# Altium footprint library TelemetriaGPRS-V3.PcbLib: 48 footprints (part 2 of 3)
Each footprint in its own frame and in the unit in brackets; x right, y up, seen from the top. Pads: shape width x height; smd on the part's side, far side on the other; paste and mask are expansions set on the pad; w line width, h text height; cw(c..) or ccw(c..) is an arc to the next point about the centre after c.
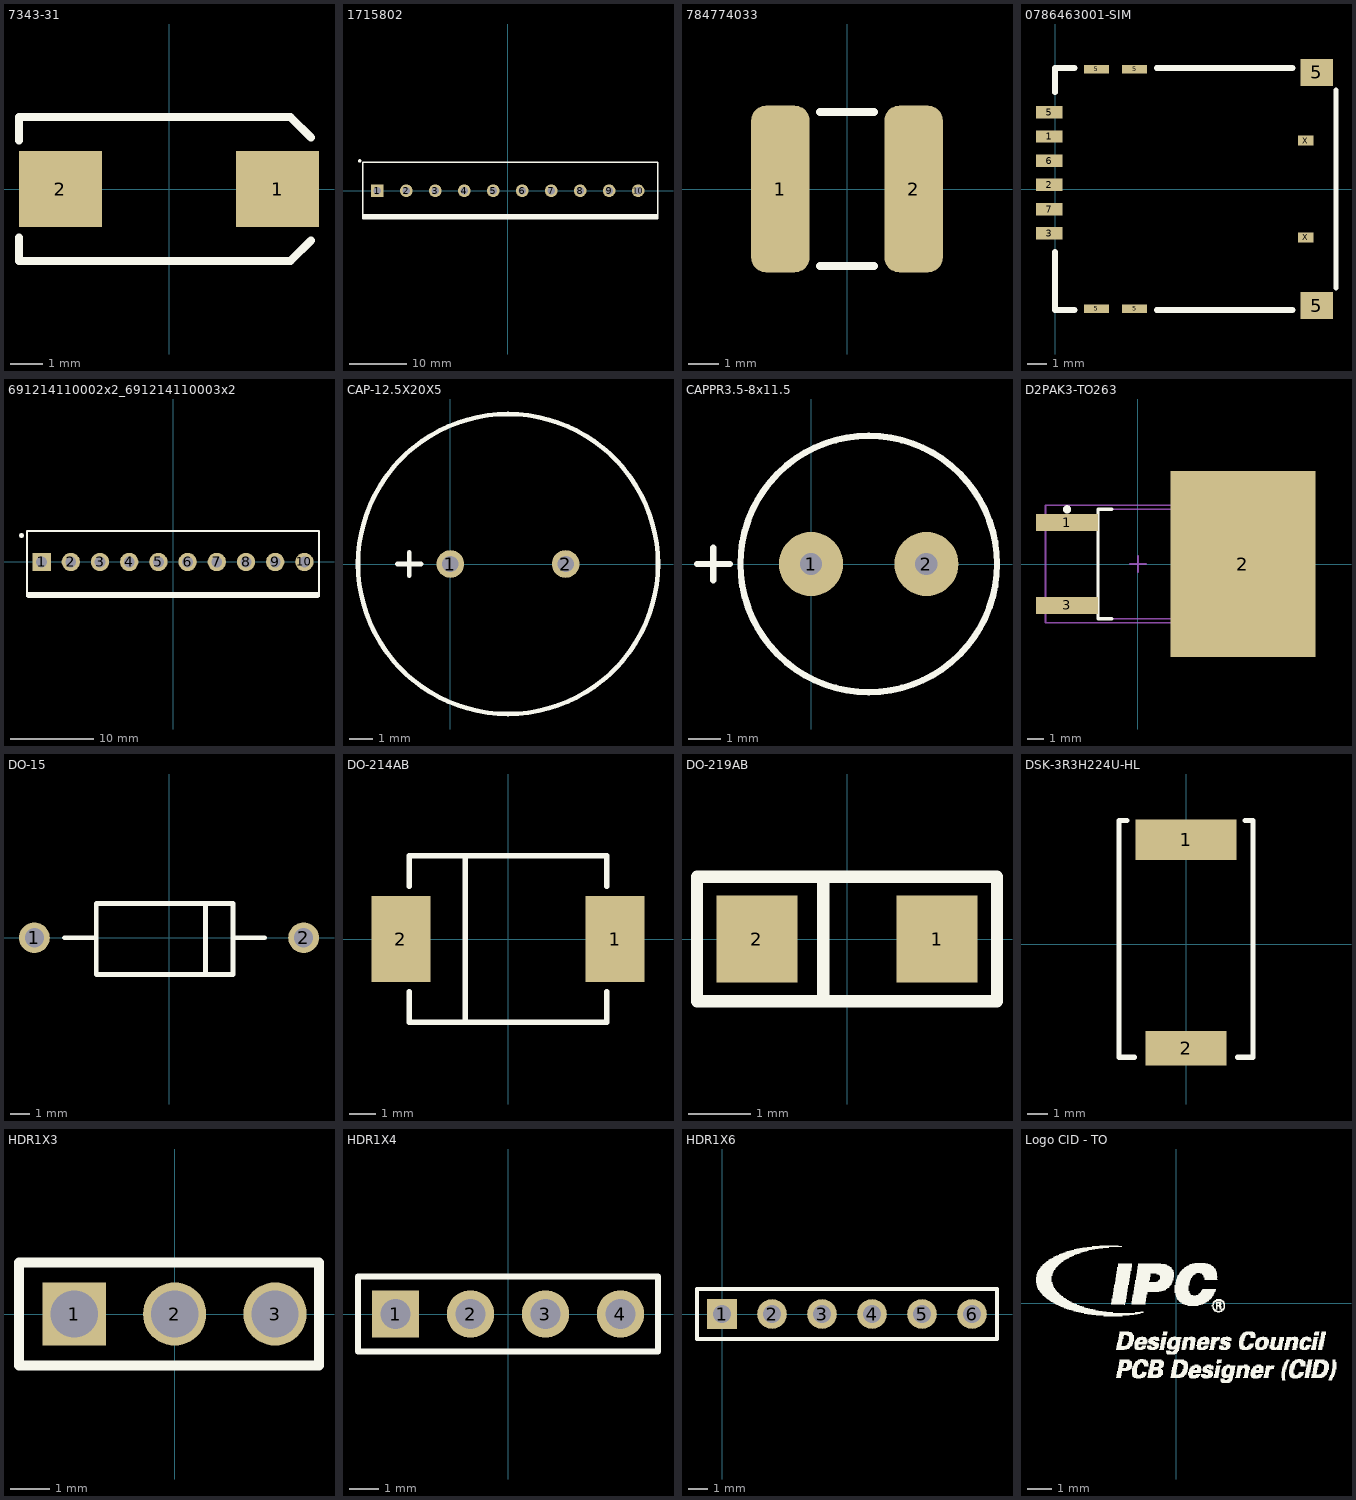
[diagram p1: the footprints below, top view; thin cyan lines are the x and y axes]

## 7343-31 [mm]
height 0.55
pads (2):
  rect 2.6x2.39 smd: 1(3.4,0) 2(-3.4,0)
Top Overlay:
  lines w0.254: -4.699,-1.524 -4.699,-2.25 3.81,-2.25 4.445,-1.615 ; -4.699,1.524 -4.699,2.25 3.81,2.25 4.445,1.615
3D body: height 3.1, standoff 0, extent -3.8,-2.286 3.8,2.314

## 1715802 [mm] "10 Position Wire to Board Terminal Block Horizontal with Board 0.200\" (5.08mm) Through Hole"
pads (11):
  round 0.6 on Top Overlay: 1(-25.828,5.207)
  rect 2.2x2.2 hole 1.3: 1(-22.78,0)
  round 2.2 hole 1.3: 2(-17.7,0) 3(-12.64,0) 4(-7.58,0) 5(-2.52,0) 6(2.54,0) 7(7.6,0) 8(12.66,0) 9(17.72,0) 10(22.78,0)
Top Overlay:
  lines w0.254: -25.28,-4.445 26.242,-4.445 ; -25.28,-4.191 26.242,-4.191 ; -25.193,-4.699 26.242,-4.699 ; -25.28,-4.9 26.242,-4.9 26.242,4.953 -25.28,4.953 ; -25.28,-4.9 -25.28,4.953 ; -25.28,-4.9 -25.28,4.953
3D body: height 14.2, standoff -3.5, extent -25.28,-4.9 26.261,4.9

## 784774033 [mm]
pads (2):
  rrect50% 1.925x5.5 smd: 1(-2.2,0) 2(2.2,0)
Top Overlay:
  lines w0.254: -0.889,-2.54 0.889,-2.54 ; -0.889,2.54 0.889,2.54
3D body: height 4.5, standoff 0, extent -2.889,-2.6 2.898,2.6

## 0786463001-SIM [mm]
pads (14):
  rect 1.4x0.65 smd: 1(-0.3,2.755) 2(-0.3,0.215) 3(-0.3,-2.325) 5(-0.3,4.025) 6(-0.3,1.485) 7(-0.3,-1.055)
  rect 1.3x0.45 smd: 5(2.17,-6.27) 5(2.17,6.27) 5(4.17,-6.27) 5(4.17,6.27)
  rect 1.7x1.4 smd: 5(13.73,-6.11) 5(13.73,6.11)
  rect 0.8x0.54 smd: X(13.15,-2.54) X(13.15,2.54)
Top Overlay:
  lines w0.254: 14.732,-5.207 14.732,5.207
  lines w0.3: 0,-3.302 0,-6.35 1.016,-6.35 ; 0,5.08 0,6.35 1.016,6.35 ; 5.334,-6.35 12.446,-6.35 ; 5.334,6.35 12.446,6.35
3D body: height 1.46, standoff 0.01, extent -0.381,-6.525 15.069,6.525

## 691214110002x2_691214110003x2 [mm] "10 Position Wire to Board Terminal Block Horizontal with Board 0.200\" (5.08mm) Through Hole"
pads (11):
  round 0.6 on Top Overlay: 1(-18.161,3.175)
  rect 2.2x2.2 hole 1.3: 1(-15.75,0)
  round 2.2 hole 1.3: 2(-12.25,0) 3(-8.75,0) 4(-5.25,0) 5(-1.75,0) 6(1.75,0) 7(5.25,0) 8(8.75,0) 9(12.25,0) 10(15.75,0)
Top Overlay:
  lines w0.254: 17.5,-3.556 17.5,-3.836 ; -17.5,-3.911 -17.5,-3.7 ; -17.5,-3.911 -17.474,-3.937 17.145,-3.937 17.399,-3.937 17.5,-3.836 ; -17.5,-3.911 -17.5,-4.09 -17.399,-4.191 17.399,-4.191 17.5,-4.09 17.5,-3.836 ; -17.5,-3.7 17.5,-3.7 17.5,3.7 -17.5,3.7 -17.5,-3.7

## CAP-12.5X20X5 [mm]
pads (2):
  round 1.2 hole 0.7: 1(0,0) 2(5,0)
Top Overlay:
  circle w0.2: c2.5,0 r6.5
  lines w0.2: -2.286,0 -1.27,0 ; -1.778,-0.508 -1.778,0.508
3D body: height 22, standoff -3, extent -3.96,-6.48 8.984,6.48

## CAPPR3.5-8x11.5 [mm]
pads (2):
  round 2 hole 0.7: 1(0,0) 2(3.6,0)
Top Overlay:
  circle w0.2: c1.8,0 r4
  lines w0.2: -3.556,0 -2.54,0 ; -3.048,-0.508 -3.048,0.508
3D body: height 11.83, standoff -3.68, extent -2.209,-4.025 5.842,4.025

## D2PAK3-TO263 [mm] "D-PAK, 3-Pads, Body 6.2x6.7mm (max), IPC Medium Density"
height 2.4
pads (3):
  rect 3.81x1.05 smd: 1(-4.35,2.54) 3(-4.35,-2.54)
  rect 8.89x11.43 smd: 2(6.429,0)
Top Overlay:
  circle w0.25: c-4.35,3.355 r0.125
  lines w0.2: -1.6,-3.35 -2.45,-3.35 -2.45,3.35 -1.6,3.35
Mechanical 13:
  lines w0.1: -2.45,-3.35 -2.45,3.35 3.75,3.35 3.75,-3.35 -2.45,-3.35
Mechanical 15:
  lines w0.1: -0.5,0 0.5,0 ; 0,-0.5 0,0.5 ; -5.675,-3.6 -5.675,3.6 5.675,3.6 5.675,-3.6 -5.675,-3.6
3D body: height 4.98, standoff -0.03, extent -5.6,-5.08 9.664,5.08

## DO-15 [mm]
height 1.5
pads (2):
  round 1.6 hole 1: 1(-7,0) 2(7,0)
Top Overlay:
  lines w0.254: -5.436,0 -3.785,0 ; 1.905,-1.905 1.905,1.778 ; 3.327,0 4.978,0 ; -3.785,0 -3.785,1.778 3.327,1.778 3.327,-1.905 -3.785,-1.905 -3.785,0
3D body: height 4.29, standoff -1.5, extent -7.23,-1.787 7.23,1.778

## DO-214AB [mm]
pads (2):
  rect 2.2x3.2 smd: 1(4,0) 2(-4,0)
Top Overlay:
  lines w0.2: -3.683,-1.967 -3.683,-3.11 3.683,-3.11 3.683,-1.967 ; -3.683,1.967 -3.683,3.11 3.683,3.11 3.683,1.967 ; -1.59,-3.11 -1.59,3.11
3D body: height 2.4, standoff 0.03, extent -4.065,-3.048 4.065,3.052

## DO-219AB [mm]
pads (2):
  rect 1.3x1.4 smd: 1(1.45,0) 2(-1.45,0)
Top Overlay:
  lines w0.2: -0.381,-1 -0.381,1 ; -2.413,-1 2.413,-1 2.413,1 -2.413,1 -2.413,-0.746 -2.413,-1
3D body: height 1.25, standoff 0, extent -1.95,-0.95 1.95,0.95

## DSK-3R3H224U-HL [mm]
pads (2):
  rect 5x2 smd: 1(0,5.151)
  rect 4x1.7 smd: 2(0,-5.151)
Top Overlay:
  lines w0.254: -2.921,6.096 -3.302,6.096 -3.302,-5.588 -2.54,-5.588 ; 2.54,-5.588 3.302,-5.588 3.302,6.096 2.921,6.096
3D body: height 2.8, standoff 0, extent -3.4,-5.588 3.4,6.112

## HDR1X3 [mm] "2.54mm THT Pin Header WR-PHD 3 terminales"
height 8.54
pads (3):
  rect 1.6x1.6 hole 1.2: 1(-2.54,0)
  round 1.6 hole 1.2: 2(0,0) 3(2.54,0)
Top Overlay:
  lines w0.254: -3.937,-1.3 3.653,-1.3 3.653,1.3 -3.937,1.3 -3.937,-1.3
3D body: height 8.62, standoff -2.92, extent -3.937,-1.349 3.683,1.191

## HDR1X4 [mm] "2.54mm THT Pin Header WR-PHD 4 pins"
pads (4):
  rect 1.6x1.6 hole 1: 1(-3.81,0)
  round 1.6 hole 1: 2(-1.27,0) 3(1.27,0) 4(3.81,0)
Top Overlay:
  lines w0.2: -5.08,-1.27 5.08,-1.27 5.08,1.27 -5.08,1.27 -5.08,-1.27
3D body: height 8.62, standoff -2.92, extent -5.08,-1.27 5.08,1.27

## HDR1X6 [mm] "Connector; Header; 6 Position"
pads (6):
  rect 1.5x1.5 hole 0.9: 1(0,0)
  round 1.5 hole 0.9: 2(2.54,0) 3(5.08,0) 4(7.62,0) 5(10.16,0) 6(12.7,0)
Top Overlay:
  lines w0.2: -1.27,-1.27 13.97,-1.27 13.97,1.27 -1.27,1.27 -1.27,-1.27

## Logo CID - TO [mm]
Top Overlay:
  drawing of 1524 lines, arcs and shapes, not listed